# Altium footprint library BMS_V2.1_Adv.PcbLib: 66 footprints (part 4 of 5)
Each footprint in its own frame and in the unit in brackets; x right, y up, seen from the top. Pads: shape width x height; smd on the part's side, far side on the other; paste and mask are expansions set on the pad; w line width, h text height; cw(c..) or ccw(c..) is an arc to the next point about the centre after c.
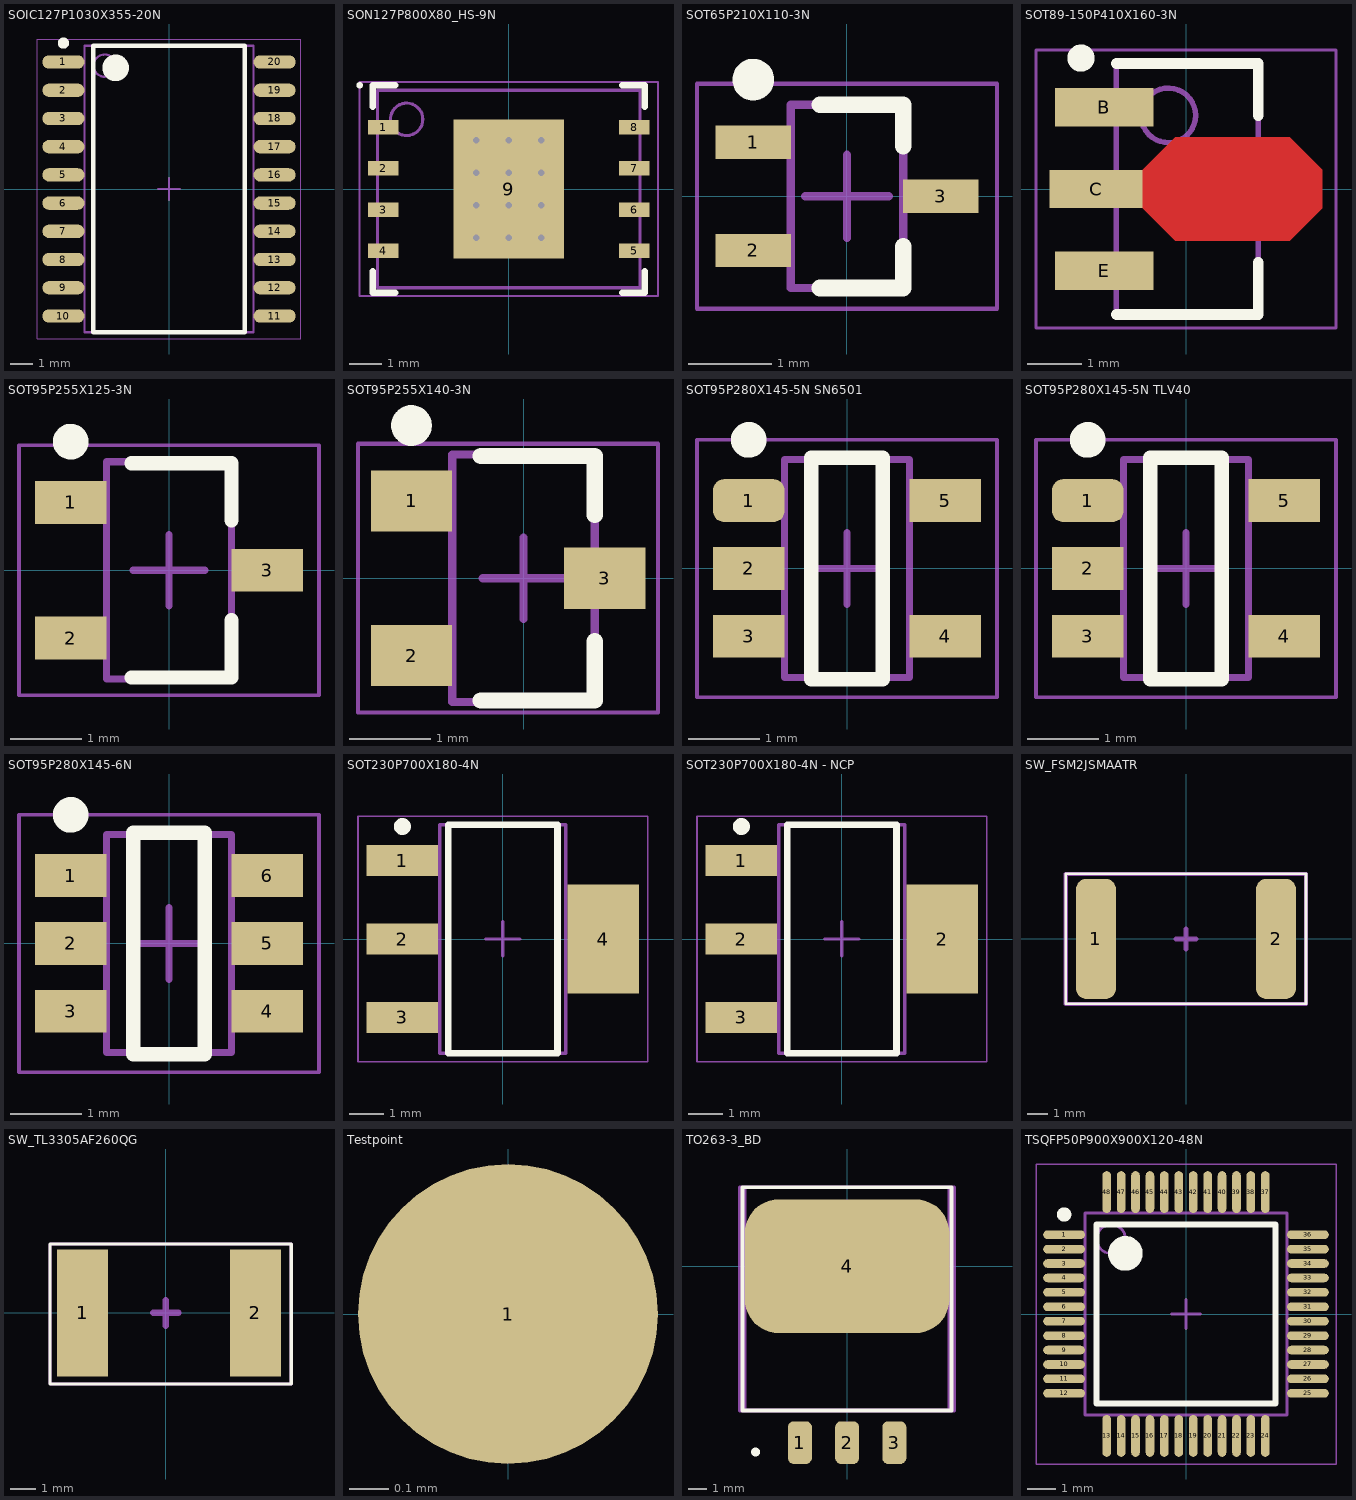
[diagram p3: the footprints below, top view; thin cyan lines are the x and y axes]

## SOIC127P1030X355-20N [mm] "SOIC, 20-Leads, Body 12.83x7.50mm, Pitch 1.27mm, IPC Medium Density"
height 3.55
pads (20):
  oval 1.9x0.6 smd: 1(-4.75,5.715) 2(-4.75,4.445) 3(-4.75,3.175) 4(-4.75,1.905) 5(-4.75,0.635) 6(-4.75,-0.635) 7(-4.75,-1.905) 8(-4.75,-3.175) 9(-4.75,-4.445) 10(-4.75,-5.715) 11(4.75,-5.715) 12(4.75,-4.445) 13(4.75,-3.175) 14(4.75,-1.905) 15(4.75,-0.635) 16(4.75,0.635) 17(4.75,1.905) 18(4.75,3.175) 19(4.75,4.445) 20(4.75,5.715)
Top Overlay:
  circle w0.25: c-4.75,6.565 r0.125
  circle w0.6: c-2.4,5.45 r0.3
  lines w0.2: -3.4,-6.45 -3.4,6.45 3.4,6.45 3.4,-6.45 -3.4,-6.45
Mechanical 13:
  circle w0.1: c-2.9,5.55 r0.5
  lines w0.1: -3.8,-6.45 -3.8,6.45 3.8,6.45 3.8,-6.45 -3.8,-6.45
  text ".Designator" at -1.143,0 h0.69
Mechanical 15:
  lines w0.05: -5.925,-6.75 -5.925,6.75 5.925,6.75 5.925,-6.75 -5.925,-6.75
  lines w0.1: -0.5,0 0.5,0 ; 0,-0.5 0,0.5
3D body "SOIC127P1030X355-20N.step": height 3.55, standoff 0, extent -5.15,-6.45 5.15,6.45

## SON127P800X80_HS-9N [mm] "SON, 8-Leads, Body 6.00x8.00mm, Pitch 1.27mm, Thermal Pad 4.30x3.40mm, IPC Medium Density"
height 0.8
pads (9):
  rect 0.95x0.45 smd: 1(-3.87,1.905) 2(-3.87,0.635) 3(-3.87,-0.635) 4(-3.87,-1.905) 5(3.87,-1.905) 6(3.87,-0.635) 7(3.87,0.635) 8(3.87,1.905)
  rect 3.4x4.3 smd paste-1.7: 9(0,0)
via 1,-1.5 diameter 0.5 hole 0.2
via 0,-1.5 diameter 0.5 hole 0.2
via -1,-1.5 diameter 0.5 hole 0.2
via 1,-0.5 diameter 0.5 hole 0.2
via 0,-0.5 diameter 0.5 hole 0.2
via -1,-0.5 diameter 0.5 hole 0.2
via 1,0.5 diameter 0.5 hole 0.2
via 0,0.5 diameter 0.5 hole 0.2
via -1,0.5 diameter 0.5 hole 0.2
via 1,1.5 diameter 0.5 hole 0.2
via 0,1.5 diameter 0.5 hole 0.2
via -1,1.5 diameter 0.5 hole 0.2
Top Overlay:
  circle w0.1: c-4.6,3.2 r0.05
  lines w0.2: -4.2,-2.53 -4.2,-3.2 -3.495,-3.2 ; -4.2,2.53 -4.2,3.2 -3.495,3.2 ; 3.495,-3.2 4.2,-3.2 4.2,-2.53 ; 3.495,3.2 4.2,3.2 4.2,2.53
Top Paste:
  rectangle: 0.665,-2.045 1.595,-0.815
  rectangle: 0.665,-0.615 1.595,0.615
  rectangle: 0.665,0.815 1.595,2.045
  rectangle: -0.465,-2.045 0.465,-0.815
  rectangle: -0.465,-0.615 0.465,0.615
  rectangle: -0.465,0.815 0.465,2.045
  rectangle: -1.595,-2.045 -0.665,-0.815
  rectangle: -1.595,-0.615 -0.665,0.615
  rectangle: -1.595,0.815 -0.665,2.045
Mechanical 13:
  circle w0.1: c-3.15,2.15 r0.5
  lines w0.1: -4.05,-3.05 4.05,-3.05 4.05,3.05 -4.05,3.05 -4.05,-3.05
  text ".Designator" at -2.032,0 h0.69
Mechanical 15:
  lines w0.05: -4.605,-3.3 4.605,-3.3 4.605,3.3 -4.605,3.3 -4.605,-3.3
  lines w0.1: -0.5,0 0.5,0 ; 0,-0.5 0,0.5
3D body "W25Q256JVEIQ.STEP": height 0.81, standoff 0.01, extent -4,-3 4,3

## SOT65P210X110-3N [mm] "SOT23, 3-Leads, Body 2.00x2.10mm, Pitch 0.65mm, IPC Medium Density"
height 1.1
pads (3):
  rect 0.9x0.4 smd: 1(-1.125,0.65) 2(-1.125,-0.65) 3(1.125,0)
Top Overlay:
  circle w0.25: c-1.125,1.4 r0.125
  lines w0.2: -0.325,-1.1 0.675,-1.1 0.675,-0.6 ; -0.325,1.1 0.675,1.1 0.675,0.6
Mechanical 13:
  lines w0.1: -0.675,-1.1 -0.675,1.1 0.675,1.1 0.675,-1.1 -0.675,-1.1
  text ".Designator" at -1.143,0 h0.69
Mechanical 15:
  lines w0.05: -1.8,-1.35 -1.8,1.35 1.8,1.35 1.8,-1.35 -1.8,-1.35
  lines w0.1: -0.5,0 0.5,0 ; 0,-0.5 0,0.5
3D body "SC-70_419AB-01_OSI.step": height 1.09, standoff 0, extent -1.197,-1.115 1.191,1.095

## SOT89-150P410X160-3N [mm] "SOT89, 3-Leads, Body 4.50x2.50mm, Pitch 1.50mm, Lead Span 4.1mm, IPC Medium Density"
height 1.6
pads (3):
  rect 1.8x0.7 smd: B(-1.5,1.5) E(-1.5,-1.5)
  rect 1.7x0.7 smd: C(-1.65,0)
Top Layer:
  region: -0.889,0.261 -0.2,0.95 1.9,0.95 2.5,0.35 2.5,-0.35 1.9,-0.95 -0.2,-0.95 -0.889,-0.261
Top Overlay:
  circle w0.25: c-1.925,2.4 r0.125
  lines w0.2: -1.275,-2.3 1.325,-2.3 1.325,-1.35 ; -1.275,2.3 1.325,2.3 1.325,1.35
Mechanical 13:
  circle w0.1: c-0.325,1.35 r0.5
  lines w0.1: -1.275,-2.3 -1.275,2.3 1.325,2.3 1.325,-2.3 -1.275,-2.3
  text ".Designator" at -1.275,0 h0.69
Mechanical 15:
  lines w0.05: -2.75,-2.55 -2.75,2.55 2.75,2.55 2.75,-2.55 -2.75,-2.55
  lines w0.1: -0.475,0 0.525,0 ; 0.025,-0.5 0.025,0.5
3D body "FCX495TA.step": height 1.61, standoff 0.01, extent -2.202,-2.25 1.928,2.25

## SOT95P255X125-3N [mm] "SOT23, 3-Leads, Body 2.90x2.55mm, Pitch 0.95mm, IPC Medium Density"
height 1.25
pads (3):
  rect 1x0.6 smd: 1(-1.375,0.95) 2(-1.375,-0.95) 3(1.375,0)
Top Overlay:
  circle w0.25: c-1.375,1.8 r0.125
  lines w0.2: -0.525,-1.5 0.875,-1.5 0.875,-0.7 ; -0.525,1.5 0.875,1.5 0.875,0.7
Mechanical 13:
  lines w0.1: -0.875,-1.52 -0.875,1.52 0.875,1.52 0.875,-1.52 -0.875,-1.52
  text ".Designator" at -1.143,0 h0.69
Mechanical 15:
  lines w0.05: -2.1,-1.75 -2.1,1.75 2.1,1.75 2.1,-1.75 -2.1,-1.75
  lines w0.1: -0.5,0 0.5,0 ; 0,-0.5 0,0.5
3D body "SOT95P255X125-3N.step": height 1.25, standoff 0, extent -1.5,-1.52 1.5,1.52

## SOT95P255X140-3N [mm] "SOT23, 3-Leads, Body 2.90x2.55mm, Pitch 0.95mm, IPC Medium Density"
height 1.4
pads (3):
  rect 1x0.75 smd: 1(-1.375,0.95) 2(-1.375,-0.95) 3(1,0)
Top Overlay:
  circle w0.25: c-1.375,1.875 r0.125
  lines w0.2: -0.525,-1.5 0.875,-1.5 0.875,-0.775 ; -0.525,1.5 0.875,1.5 0.875,0.775
Mechanical 13:
  lines w0.1: -0.875,-1.52 -0.875,1.52 0.875,1.52 0.875,-1.52 -0.875,-1.52
  text ".Designator" at -1.397,0 h0.69
Mechanical 15:
  lines w0.05: -2.032,-1.651 -2.032,1.651 1.651,1.651 1.651,-1.651 -2.032,-1.651
  lines w0.1: -0.5,0 0.5,0 ; 0,-0.5 0,0.5
3D body "ESDA6V1L.STEP": height 1.05, standoff -0.09, extent -1.479,-1.45 0.921,1.45

## SOT95P280X145-5N SN6501 [mm] "SOT23, 5-Leads, Body 2.90x2.80mm, Pitch 0.95mm, IPC Medium Density"
height 1.45
pads (5):
  rrect50% 1x0.6 smd: 1(-1.375,0.95)
  rect 1x0.6 smd: 2(-1.375,0) 3(-1.375,-0.95) 4(1.375,-0.95) 5(1.375,0.95)
Top Overlay:
  circle w0.25: c-1.375,1.8 r0.125
  lines w0.2: -0.5,-1.55 -0.5,1.55 0.5,1.55 0.5,-1.55 -0.5,-1.55
Mechanical 13:
  lines w0.1: -0.875,-1.525 0.875,-1.525 0.875,1.525 -0.875,1.525 -0.875,-1.525
  text ".Designator" at -1.27,0 h0.69
Mechanical 15:
  lines w0.05: -2.1,-1.8 2.1,-1.8 2.1,1.8 -2.1,1.8 -2.1,-1.8
  lines w0.1: -0.5,0 0.5,0 ; 0,-0.5 0,0.5
3D body "SN6501DBVR.step": height 1.31, standoff -0.14, extent -1.4,-1.45 1.4,1.45

## SOT95P280X145-5N TLV40 [mm] "SOT23, 5-Leads, Body 2.90x2.80mm, Pitch 0.95mm, IPC Medium Density"
height 1.45
pads (5):
  rrect50% 1x0.6 smd: 1(-1.375,0.95)
  rect 1x0.6 smd: 2(-1.375,0) 3(-1.375,-0.95) 4(1.375,-0.95) 5(1.375,0.95)
Top Overlay:
  circle w0.25: c-1.375,1.8 r0.125
  lines w0.2: -0.5,-1.55 -0.5,1.55 0.5,1.55 0.5,-1.55 -0.5,-1.55
Mechanical 13:
  lines w0.1: -0.875,-1.525 0.875,-1.525 0.875,1.525 -0.875,1.525 -0.875,-1.525
  text ".Designator" at -1.27,0 h0.69
Mechanical 15:
  lines w0.05: -2.1,-1.8 2.1,-1.8 2.1,1.8 -2.1,1.8 -2.1,-1.8
  lines w0.1: -0.5,0 0.5,0 ; 0,-0.5 0,0.5
3D body "TLV70433DBVR.step": height 1.31, standoff -0.14, extent -1.4,-1.45 1.4,1.45

## SOT95P280X145-6N [mm] "SOT23, 6-Leads, Body 2.93x2.80mm, Pitch 0.95mm, IPC Medium Density"
height 1.45
pads (6):
  rect 1x0.6 smd: 1(-1.375,0.95) 2(-1.375,0) 3(-1.375,-0.95) 4(1.375,-0.95) 5(1.375,0) 6(1.375,0.95)
Top Overlay:
  circle w0.25: c-1.375,1.8 r0.125
  lines w0.2: -0.5,-1.55 0.5,-1.55 0.5,1.55 -0.5,1.55 -0.5,-1.55
Mechanical 13:
  lines w0.1: -0.875,-1.525 -0.875,1.525 0.875,1.525 0.875,-1.525 -0.875,-1.525
  text ".Designator" at -0.875,0 h0.69
Mechanical 15:
  lines w0.05: -2.1,-1.8 -2.1,1.8 2.1,1.8 2.1,-1.8 -2.1,-1.8
  lines w0.1: -0.5,0 0.5,0 ; 0,-0.5 0,0.5
3D body "SOT95P280X145-6N.step": height 1.45, standoff 0, extent -1.5,-1.525 1.5,1.525

## SOT230P700X180-4N [mm] "SOT223, 4-Leads, Body 6.50x7.00mm (avg), Pitch 2.30mm, IPC Medium Density"
height 1.8
pads (4):
  rect 2.1x0.9 smd: 1(-2.95,2.3) 2(-2.95,0) 3(-2.95,-2.3)
  rect 2.1x3.2 smd: 4(2.95,0)
Top Overlay:
  circle w0.25: c-2.95,3.3 r0.125
  lines w0.2: -1.6,-3.35 1.6,-3.35 1.6,3.35 -1.6,3.35 -1.6,-3.35
Mechanical 13:
  lines w0.1: -1.85,-3.35 1.85,-3.35 1.85,3.35 -1.85,3.35 -1.85,-3.35
  text ".Designator" at -1.016,0 h0.69
Mechanical 15:
  lines w0.05: -4.25,-3.6 4.25,-3.6 4.25,3.6 -4.25,3.6 -4.25,-3.6
  lines w0.1: -0.5,0 0.5,0 ; 0,-0.5 0,0.5
3D body "SC73-SOT223_NEX.step": height 1.81, standoff 0, extent -3.645,-3.353 3.645,3.353

## SOT230P700X180-4N - NCP [mm] "SOT223, 4-Leads, Body 6.50x7.00mm (avg), Pitch 2.30mm, IPC Medium Density"
height 1.8
pads (4):
  rect 2.1x0.9 smd: 1(-2.95,2.3) 2(-2.95,0) 3(-2.95,-2.3)
  rect 2.1x3.2 smd: 2(2.95,0)
Top Overlay:
  circle w0.25: c-2.95,3.3 r0.125
  lines w0.2: -1.6,-3.35 -1.6,3.35 1.6,3.35 1.6,-3.35 -1.6,-3.35
Mechanical 13:
  lines w0.1: -1.85,-3.35 -1.85,3.35 1.85,3.35 1.85,-3.35 -1.85,-3.35
  text ".Designator" at -1.016,0 h0.69
Mechanical 15:
  lines w0.05: -4.25,-3.6 -4.25,3.6 4.25,3.6 4.25,-3.6 -4.25,-3.6
  lines w0.1: -0.5,0 0.5,0 ; 0,-0.5 0,0.5
3D body "NCP1117ST50T3G.step": height 1.7, standoff -0.1, extent -3.499,-3.25 3.499,3.25

## SW_FSM2JSMAATR [mm] "FSM2JSMAATR"
height 4.3
pads (2):
  rrect50% 2x6 smd: 1(-4.5,0) 2(4.5,0)
Top Overlay:
  lines w0.127: -6.013,-3.25 6,-3.25 6,3.25 -6.013,3.25 -6.013,-3.25
Mechanical 13:
  lines w0.203: -6.013,-3.263 -6.013,3.25 6,3.25 6,-3.263 -6.013,-3.263
  text ".Designator" at -1.016,0 h0.69
Mechanical 15:
  lines w0.203: -6,-3.25 6,-3.25 6,3.25 -6,3.25 -6,-3.25
  lines w0.254: -0.5,0 0.5,0 ; 0,-0.5 0,0.5
3D body "c-2-1437565-9-v-3d.stp": height 4.39, standoff 0.01, extent -5,-3 5,3

## SW_TL3305AF260QG [mm] "TL3305AF260QG"
height 4.3
pads (2):
  rect 2x5 smd: 1(-3.277,0) 2(3.531,0)
Top Overlay:
  lines w0.127: -4.559,-2.794 4.941,-2.794 4.941,2.706 -4.559,2.706 -4.559,-2.794
Mechanical 13:
  lines w0.127: -4.559,-2.794 4.941,-2.794 4.941,2.706 -4.559,2.706 -4.559,-2.794
  text ".Designator" at -1.016,0 h0.69
Mechanical 15:
  lines w0.127: -4.559,-2.794 4.941,-2.794 4.941,2.706 -4.559,2.706 -4.559,-2.794
  lines w0.254: -0.5,0 0.5,0 ; 0,-0.5 0,0.5
3D body "TL3305AFxxxxG.stp": height 3.7, standoff -0.1, extent -3.75,-2.25 3.75,2.25

## Testpoint [mil]
pads (1):
  round 30 smd: 1(0,0)
Mechanical 13:
  text ".Designator" at 0,0 h27

## TO263-3_BD [mm] "TO263-3"
height 4.57
pads (4):
  rrect50% 1.295x2.3 smd: 1(-2.54,-9.5) 2(0,-9.5) 3(2.54,-9.5)
  rrect50% 11x7.2 smd: 4(0,0)
Top Overlay:
  circle w0.254: c0,0 r0.539
  circle w0.254: c-4.928,-10.008 r0.114
  lines w0.203: -5.638,-7.763 5.625,-7.763 5.625,4.25 -5.638,4.25 -5.638,-7.763
Mechanical 13:
  circle w0.254: c0,0 r0.631
  lines w0.203: -5.513,-7.763 5.5,-7.763 5.5,4.25 -5.513,4.25 -5.513,-7.763
  text ".Designator" at -1.143,0 h0.69
Mechanical 15:
  lines w0.203: -5.763,-7.763 5.75,-7.763 5.75,4.25 -5.763,4.25 -5.763,-7.763
  lines w0.254: -0.5,0 0.5,0 ; 0,-0.5 0,0.5
3D body "TO252-3_ROM.step": height 2.56, standoff 0.01, extent -3.251,-7.252 3.251,2.758

## TSQFP50P900X900X120-48N [mm] "TSQFP, 48-Leads, Body 7.00x7.00mm, Pitch 0.50mm, IPC Medium Density"
height 1.2
pads (48):
  oval 1.45x0.3 smd: 1(-4.225,2.75) 2(-4.225,2.25) 3(-4.225,1.75) 4(-4.225,1.25) 5(-4.225,0.75) 6(-4.225,0.25) 7(-4.225,-0.25) 8(-4.225,-0.75) 9(-4.225,-1.25) 10(-4.225,-1.75) 11(-4.225,-2.25) 12(-4.225,-2.75) 25(4.225,-2.75) 26(4.225,-2.25) 27(4.225,-1.75) 28(4.225,-1.25) 29(4.225,-0.75) 30(4.225,-0.25) 31(4.225,0.25) 32(4.225,0.75) 33(4.225,1.25) 34(4.225,1.75) 35(4.225,2.25) 36(4.225,2.75)
  oval 0.3x1.45 smd: 13(-2.75,-4.225) 14(-2.25,-4.225) 15(-1.75,-4.225) 16(-1.25,-4.225) 17(-0.75,-4.225) 18(-0.25,-4.225) 19(0.25,-4.225) 20(0.75,-4.225) 21(1.25,-4.225) 22(1.75,-4.225) 23(2.25,-4.225) 24(2.75,-4.225) 37(2.75,4.225) 38(2.25,4.225) 39(1.75,4.225) 40(1.25,4.225) 41(0.75,4.225) 42(0.25,4.225) 43(-0.25,4.225) 44(-0.75,4.225) 45(-1.25,4.225) 46(-1.75,4.225) 47(-2.25,4.225) 48(-2.75,4.225)
Top Overlay:
  circle w0.25: c-4.225,3.45 r0.125
  circle w0.6: c-2.1,2.1 r0.3
  lines w0.2: -3.1,-3.1 -3.1,3.1 3.1,3.1 3.1,-3.1 -3.1,-3.1
Mechanical 13:
  circle w0.1: c-2.6,2.6 r0.5
  lines w0.1: -3.5,-3.5 -3.5,3.5 3.5,3.5 3.5,-3.5 -3.5,-3.5
  text ".Designator" at -1.016,0 h0.69
Mechanical 15:
  lines w0.05: -5.2,-5.2 -5.2,5.2 5.2,5.2 5.2,-5.2 -5.2,-5.2
  lines w0.1: -0.5,0 0.5,0 ; 0,-0.5 0,0.5
3D body "BQ7695203PFBR.STEP": height 1.06, standoff -0.14, extent -4.5,-4.5 4.5,4.5